# Altium schematic symbol library jlcpcb_2025_04_capacitors_extended_1206.schlib: 2503 symbols (part 8 of 14) (continued)
## CGA5L2X7R1E105KT0Y0N
designator C?  Capacitance: 1uF  (hidden comment: *)
Capacitor, Ceramic (MLCC), 1uF, ±10%, 25V, X7R, ±10%, SMD 1206; Manufacturer: TDK; Manufacturer Part Number: CGA5L2X7R1E105KT0Y0N; Package Size: 1206; JLCPCB Basic Part: No; JLCPCB Part Number: C342842; Supplier 1: LCSC; Category: Capacitors - MLCC; Supplier Part Number 1: C342842; Tolerance: ±10%; Voltage Rating: 25V; Temperature Coefficient: X7R; RoHS: Yes; ComponentLink1Description: Datasheet; ComponentLink1URL: https://wmsc.lcsc.com/wmsc/upload/file/pdf/v2/lcsc/2304140030_TDK-CGA5L2X7R1E105KT0Y0N_C342842.pdf; ComponentLink2Description: JLCPCB Part URL; ComponentLink2URL: https://jlcpcb.com/partdetail/C342842; ComponentLink3Description: LCSC Part URL; ComponentLink3URL: https://lcsc.com/product-detail/Multilayer-Ceramic-Capacitors-MLCC---SMD-SMT_TDK-TDK-CGA5L2X7R1E105KT0Y0N_C342842.html
footprint CAP-1206 (1206 (3216M) Capacitor)
pins: 1, 2

## CGA5L2X7R1E225KT0Y0N
designator C?  Capacitance: 2.2uF  (hidden comment: *)
Capacitor, Ceramic (MLCC), 2.2uF, ±10%, 25V, X7R, ±10%, SMD 1206; Manufacturer: TDK; Manufacturer Part Number: CGA5L2X7R1E225KT0Y0N; Package Size: 1206; JLCPCB Basic Part: No; JLCPCB Part Number: C2939049; Supplier 1: LCSC; Category: Capacitors - MLCC; Supplier Part Number 1: C2939049; Tolerance: ±10%; Voltage Rating: 25V; Temperature Coefficient: X7R; RoHS: Yes; ComponentLink1Description: Datasheet; ComponentLink1URL: https://wmsc.lcsc.com/wmsc/upload/file/pdf/v2/lcsc/2208240930_TDK-CGA5L2X7R1E225KT0Y0N_C2939049.pdf; ComponentLink2Description: JLCPCB Part URL; ComponentLink2URL: https://jlcpcb.com/partdetail/C2939049; ComponentLink3Description: LCSC Part URL; ComponentLink3URL: https://lcsc.com/product-detail/Multilayer-Ceramic-Capacitors-MLCC---SMD-SMT_TDK-TDK-CGA5L2X7R1E225KT0Y0N_C2939049.html
footprint CAP-1206 (1206 (3216M) Capacitor)
pins: 1, 2

## CGA5L2X7R1H684KT0Y0N
designator C?  Capacitance: 680nF  (hidden comment: *)
Capacitor, Ceramic (MLCC), 680nF, ±10%, 50V, X7R, ±10%, SMD 1206; Manufacturer: TDK; Manufacturer Part Number: CGA5L2X7R1H684KT0Y0N; Package Size: 1206; JLCPCB Basic Part: No; JLCPCB Part Number: C342826; Supplier 1: LCSC; Category: Capacitors - MLCC; Supplier Part Number 1: C342826; Tolerance: ±10%; Voltage Rating: 50V; Temperature Coefficient: X7R; RoHS: Yes; ComponentLink1Description: Datasheet; ComponentLink1URL: https://wmsc.lcsc.com/wmsc/upload/file/pdf/v2/lcsc/2304140030_TDK-CGA5L2X7R1H684KT0Y0N_C342826.pdf; ComponentLink2Description: JLCPCB Part URL; ComponentLink2URL: https://jlcpcb.com/partdetail/C342826; ComponentLink3Description: LCSC Part URL; ComponentLink3URL: https://lcsc.com/product-detail/Multilayer-Ceramic-Capacitors-MLCC---SMD-SMT_TDK-TDK-CGA5L2X7R1H684KT0Y0N_C342826.html
footprint CAP-1206 (1206 (3216M) Capacitor)
pins: 1, 2

## CGA5L2X7R2A104KT0Y0U
designator C?  Capacitance: 100nF  (hidden comment: *)
Capacitor, Ceramic (MLCC), 100nF, ±10%, 100V, X7R, ±10%, SMD 1206; Manufacturer: TDK; Manufacturer Part Number: CGA5L2X7R2A104KT0Y0U; Package Size: 1206; JLCPCB Basic Part: No; JLCPCB Part Number: C338057; Supplier 1: LCSC; Category: Capacitors - MLCC; Supplier Part Number 1: C338057; Tolerance: ±10%; Voltage Rating: 100V; Temperature Coefficient: X7R; RoHS: Yes; ComponentLink1Description: Datasheet; ComponentLink1URL: https://wmsc.lcsc.com/wmsc/upload/file/pdf/v2/lcsc/2304140030_TDK-CGA5L2X7R2A104KT0Y0U_C338057.pdf; ComponentLink2Description: JLCPCB Part URL; ComponentLink2URL: https://jlcpcb.com/partdetail/C338057; ComponentLink3Description: LCSC Part URL; ComponentLink3URL: https://lcsc.com/product-detail/Multilayer-Ceramic-Capacitors-MLCC---SMD-SMT_TDK-TDK-CGA5L2X7R2A104KT0Y0U_C338057.html
footprint CAP-1206 (1206 (3216M) Capacitor)
pins: 1, 2

## CGA5L2X7R2A105KT0Y0U
designator C?  Capacitance: 1uF  (hidden comment: *)
Capacitor, Ceramic (MLCC), 1uF, ±10%, 100V, X7R, ±10%, SMD 1206; Manufacturer: TDK; Manufacturer Part Number: CGA5L2X7R2A105KT0Y0U; Package Size: 1206; JLCPCB Basic Part: No; JLCPCB Part Number: C329948; Supplier 1: LCSC; Category: Capacitors - MLCC; Supplier Part Number 1: C329948; Tolerance: ±10%; Voltage Rating: 100V; Temperature Coefficient: X7R; RoHS: Yes; ComponentLink1Description: Datasheet; ComponentLink1URL: https://wmsc.lcsc.com/wmsc/upload/file/pdf/v2/lcsc/2304140030_TDK-CGA5L2X7R2A105KT0Y0U_C329948.pdf; ComponentLink2Description: JLCPCB Part URL; ComponentLink2URL: https://jlcpcb.com/partdetail/C329948; ComponentLink3Description: LCSC Part URL; ComponentLink3URL: https://lcsc.com/product-detail/Multilayer-Ceramic-Capacitors-MLCC---SMD-SMT_TDK-TDK-CGA5L2X7R2A105KT0Y0U_C329948.html
footprint CAP-1206 (1206 (3216M) Capacitor)
pins: 1, 2

## CGA5L2X7R2A474KT0Y0U
designator C?  Capacitance: 470nF  (hidden comment: *)
Capacitor, Ceramic (MLCC), 470nF, ±10%, 100V, X7R, ±10%, SMD 1206; Manufacturer: TDK; Manufacturer Part Number: CGA5L2X7R2A474KT0Y0U; Package Size: 1206; JLCPCB Basic Part: No; JLCPCB Part Number: C338107; Supplier 1: LCSC; Category: Capacitors - MLCC; Supplier Part Number 1: C338107; Tolerance: ±10%; Voltage Rating: 100V; Temperature Coefficient: X7R; RoHS: Yes; ComponentLink1Description: Datasheet; ComponentLink1URL: https://wmsc.lcsc.com/wmsc/upload/file/pdf/v2/lcsc/2304140030_TDK-CGA5L2X7R2A474KT0Y0U_C338107.pdf; ComponentLink2Description: JLCPCB Part URL; ComponentLink2URL: https://jlcpcb.com/partdetail/C338107; ComponentLink3Description: LCSC Part URL; ComponentLink3URL: https://lcsc.com/product-detail/Multilayer-Ceramic-Capacitors-MLCC---SMD-SMT_TDK-TDK-CGA5L2X7R2A474KT0Y0U_C338107.html
footprint CAP-1206 (1206 (3216M) Capacitor)
pins: 1, 2

## CGA5L3X5R1H106KT0Y0N
designator C?  Capacitance: 10uF  (hidden comment: *)
Capacitor, Ceramic (MLCC), 10uF, ±10%, 50V, X5R, ±10%, SMD 1206; Manufacturer: TDK; Manufacturer Part Number: CGA5L3X5R1H106KT0Y0N; Package Size: 1206; JLCPCB Basic Part: No; JLCPCB Part Number: C338079; Supplier 1: LCSC; Category: Capacitors - MLCC; Supplier Part Number 1: C338079; Tolerance: ±10%; Voltage Rating: 50V; Temperature Coefficient: X5R; RoHS: Yes; ComponentLink1Description: Datasheet; ComponentLink1URL: https://wmsc.lcsc.com/wmsc/upload/file/pdf/v2/lcsc/2304140030_TDK-CGA5L3X5R1H106KT0Y0N_C338079.pdf; ComponentLink2Description: JLCPCB Part URL; ComponentLink2URL: https://jlcpcb.com/partdetail/C338079; ComponentLink3Description: LCSC Part URL; ComponentLink3URL: https://lcsc.com/product-detail/Multilayer-Ceramic-Capacitors-MLCC---SMD-SMT_TDK-TDK-CGA5L3X5R1H106KT0Y0N_C338079.html
footprint CAP-1206 (1206 (3216M) Capacitor)
pins: 1, 2

## CGA5L3X7R1H105KT0Y0N
designator C?  Capacitance: 1uF  (hidden comment: *)
Capacitor, Ceramic (MLCC), 1uF, ±10%, 50V, X7R, ±10%, SMD 1206; Manufacturer: TDK; Manufacturer Part Number: CGA5L3X7R1H105KT0Y0N; Package Size: 1206; JLCPCB Basic Part: No; JLCPCB Part Number: C329965; Supplier 1: LCSC; Category: Capacitors - MLCC; Supplier Part Number 1: C329965; Tolerance: ±10%; Voltage Rating: 50V; Temperature Coefficient: X7R; RoHS: Yes; ComponentLink1Description: Datasheet; ComponentLink1URL: https://wmsc.lcsc.com/wmsc/upload/file/pdf/v2/lcsc/2304140030_TDK-CGA5L3X7R1H105KT0Y0N_C329965.pdf; ComponentLink2Description: JLCPCB Part URL; ComponentLink2URL: https://jlcpcb.com/partdetail/C329965; ComponentLink3Description: LCSC Part URL; ComponentLink3URL: https://lcsc.com/product-detail/Multilayer-Ceramic-Capacitors-MLCC---SMD-SMT_TDK-TDK-CGA5L3X7R1H105KT0Y0N_C329965.html
footprint CAP-1206 (1206 (3216M) Capacitor)
pins: 1, 2

## CGA5L3X7R1H105KT0Y0S
designator C?  Capacitance: 1uF  (hidden comment: *)
Capacitor, Ceramic (MLCC), 1uF, ±10%, 50V, X7R, ±10%, SMD 1206; Manufacturer: TDK; Manufacturer Part Number: CGA5L3X7R1H105KT0Y0S; Package Size: 1206; JLCPCB Basic Part: No; JLCPCB Part Number: C432948; Supplier 1: LCSC; Category: Capacitors - MLCC; Supplier Part Number 1: C432948; Tolerance: ±10%; Voltage Rating: 50V; Temperature Coefficient: X7R; RoHS: Yes; ComponentLink1Description: Datasheet; ComponentLink1URL: https://wmsc.lcsc.com/wmsc/upload/file/pdf/v2/lcsc/2304140030_TDK-CGA5L3X7R1H105KT0Y0S_C432948.pdf; ComponentLink2Description: JLCPCB Part URL; ComponentLink2URL: https://jlcpcb.com/partdetail/C432948; ComponentLink3Description: LCSC Part URL; ComponentLink3URL: https://lcsc.com/product-detail/Multilayer-Ceramic-Capacitors-MLCC---SMD-SMT_TDK-TDK-CGA5L3X7R1H105KT0Y0S_C432948.html
footprint CAP-1206 (1206 (3216M) Capacitor)
pins: 1, 2

## CGA5L3X7R1H225KT0Y0N
designator C?  Capacitance: 2.2uF  (hidden comment: *)
Capacitor, Ceramic (MLCC), 2.2uF, ±10%, 50V, X7R, ±10%, SMD 1206; Manufacturer: TDK; Manufacturer Part Number: CGA5L3X7R1H225KT0Y0N; Package Size: 1206; JLCPCB Basic Part: No; JLCPCB Part Number: C342683; Supplier 1: LCSC; Category: Capacitors - MLCC; Supplier Part Number 1: C342683; Tolerance: ±10%; Voltage Rating: 50V; Temperature Coefficient: X7R; RoHS: Yes; ComponentLink1Description: Datasheet; ComponentLink1URL: https://wmsc.lcsc.com/wmsc/upload/file/pdf/v2/lcsc/2304140030_TDK-CGA5L3X7R1H225KT0Y0N_C342683.pdf; ComponentLink2Description: JLCPCB Part URL; ComponentLink2URL: https://jlcpcb.com/partdetail/C342683; ComponentLink3Description: LCSC Part URL; ComponentLink3URL: https://lcsc.com/product-detail/Multilayer-Ceramic-Capacitors-MLCC---SMD-SMT_TDK-TDK-CGA5L3X7R1H225KT0Y0N_C342683.html
footprint CAP-1206 (1206 (3216M) Capacitor)
pins: 1, 2

## CGA5L3X7R1H225KT0Y0S
designator C?  Capacitance: 2.2uF  (hidden comment: *)
Capacitor, Ceramic (MLCC), 2.2uF, ±10%, 50V, X7R, ±10%, SMD 1206; Manufacturer: TDK; Manufacturer Part Number: CGA5L3X7R1H225KT0Y0S; Package Size: 1206; JLCPCB Basic Part: No; JLCPCB Part Number: C338116; Supplier 1: LCSC; Category: Capacitors - MLCC; Supplier Part Number 1: C338116; Tolerance: ±10%; Voltage Rating: 50V; Temperature Coefficient: X7R; RoHS: Yes; ComponentLink1Description: Datasheet; ComponentLink1URL: https://wmsc.lcsc.com/wmsc/upload/file/pdf/v2/lcsc/2304140030_TDK-CGA5L3X7R1H225KT0Y0S_C338116.pdf; ComponentLink2Description: JLCPCB Part URL; ComponentLink2URL: https://jlcpcb.com/partdetail/C338116; ComponentLink3Description: LCSC Part URL; ComponentLink3URL: https://lcsc.com/product-detail/Multilayer-Ceramic-Capacitors-MLCC---SMD-SMT_TDK-TDK-CGA5L3X7R1H225KT0Y0S_C338116.html
footprint CAP-1206 (1206 (3216M) Capacitor)
pins: 1, 2

## CGA5L3X7R1H475KT000N
designator C?  Capacitance: 4.7uF  (hidden comment: *)
Capacitor, Ceramic (MLCC), 4.7uF, ±10%, 50V, X7R, ±10%, SMD 1206; Manufacturer: TDK; Manufacturer Part Number: CGA5L3X7R1H475KT000N; Package Size: 1206; JLCPCB Basic Part: No; JLCPCB Part Number: C342665; Supplier 1: LCSC; Category: Capacitors - MLCC; Supplier Part Number 1: C342665; Tolerance: ±10%; Voltage Rating: 50V; Temperature Coefficient: X7R; RoHS: Yes; ComponentLink1Description: Datasheet; ComponentLink1URL: https://wmsc.lcsc.com/wmsc/upload/file/pdf/v2/lcsc/2304140030_TDK-CGA5L3X7R1H475KT000N_C342665.pdf; ComponentLink2Description: JLCPCB Part URL; ComponentLink2URL: https://jlcpcb.com/partdetail/C342665; ComponentLink3Description: LCSC Part URL; ComponentLink3URL: https://lcsc.com/product-detail/Multilayer-Ceramic-Capacitors-MLCC---SMD-SMT_TDK-TDK-CGA5L3X7R1H475KT000N_C342665.html
footprint CAP-1206 (1206 (3216M) Capacitor)
pins: 1, 2

## CGA5L3X7R2E104KT0Y0U
designator C?  Capacitance: 100nF  (hidden comment: *)
Capacitor, Ceramic (MLCC), 100nF, ±10%, 250V, X7R, ±10%, SMD 1206; Manufacturer: TDK; Manufacturer Part Number: CGA5L3X7R2E104KT0Y0U; Package Size: 1206; JLCPCB Basic Part: No; JLCPCB Part Number: C342817; Supplier 1: LCSC; Category: Capacitors - MLCC; Supplier Part Number 1: C342817; Tolerance: ±10%; Voltage Rating: 250V; Temperature Coefficient: X7R; RoHS: Yes; ComponentLink1Description: Datasheet; ComponentLink1URL: https://wmsc.lcsc.com/wmsc/upload/file/pdf/v2/lcsc/2304140030_TDK-CGA5L3X7R2E104KT0Y0U_C342817.pdf; ComponentLink2Description: JLCPCB Part URL; ComponentLink2URL: https://jlcpcb.com/partdetail/C342817; ComponentLink3Description: LCSC Part URL; ComponentLink3URL: https://lcsc.com/product-detail/Multilayer-Ceramic-Capacitors-MLCC---SMD-SMT_TDK-TDK-CGA5L3X7R2E104KT0Y0U_C342817.html
footprint CAP-1206 (1206 (3216M) Capacitor)
pins: 1, 2

## CGA5L3X7S2A225KT0Y0N
designator C?  Capacitance: 2.2uF  (hidden comment: *)
Capacitor, Ceramic (MLCC), 2.2uF, ±10%, 100V, X7S, ±10%, SMD 1206; Manufacturer: TDK; Manufacturer Part Number: CGA5L3X7S2A225KT0Y0N; Package Size: 1206; JLCPCB Basic Part: No; JLCPCB Part Number: C342669; Supplier 1: LCSC; Category: Capacitors - MLCC; Supplier Part Number 1: C342669; Tolerance: ±10%; Voltage Rating: 100V; Temperature Coefficient: X7S; RoHS: Yes; ComponentLink1Description: Datasheet; ComponentLink1URL: https://wmsc.lcsc.com/wmsc/upload/file/pdf/v2/lcsc/2304140030_TDK-CGA5L3X7S2A225KT0Y0N_C342669.pdf; ComponentLink2Description: JLCPCB Part URL; ComponentLink2URL: https://jlcpcb.com/partdetail/C342669; ComponentLink3Description: LCSC Part URL; ComponentLink3URL: https://lcsc.com/product-detail/Multilayer-Ceramic-Capacitors-MLCC---SMD-SMT_TDK-TDK-CGA5L3X7S2A225KT0Y0N_C342669.html
footprint CAP-1206 (1206 (3216M) Capacitor)
pins: 1, 2

## CGA5L3X8R1E225KT0Y0N
designator C?  Capacitance: 2.2uF  (hidden comment: *)
Capacitor, Ceramic (MLCC), 2.2uF, ±10%, 25V, X8R, ±10%, SMD 1206; Manufacturer: TDK; Manufacturer Part Number: CGA5L3X8R1E225KT0Y0N; Package Size: 1206; JLCPCB Basic Part: No; JLCPCB Part Number: C694517; Supplier 1: LCSC; Category: Capacitors - MLCC; Supplier Part Number 1: C694517; Tolerance: ±10%; Voltage Rating: 25V; Temperature Coefficient: X8R; RoHS: Yes; ComponentLink1Description: Datasheet; ComponentLink1URL: https://wmsc.lcsc.com/wmsc/upload/file/pdf/v2/lcsc/2208221800_TDK-CGA5L3X8R1E225KT0Y0N_C694517.pdf; ComponentLink2Description: JLCPCB Part URL; ComponentLink2URL: https://jlcpcb.com/partdetail/C694517; ComponentLink3Description: LCSC Part URL; ComponentLink3URL: https://lcsc.com/product-detail/Multilayer-Ceramic-Capacitors-MLCC---SMD-SMT_TDK-TDK-CGA5L3X8R1E225KT0Y0N_C694517.html
footprint CAP-1206 (1206 (3216M) Capacitor)
pins: 1, 2

## CGA5L3X8R1H105KT0Y0N
designator C?  Capacitance: 1uF  (hidden comment: *)
Capacitor, Ceramic (MLCC), 1uF, ±10%, X8R, ±10%, SMD 1206; Manufacturer: TDK; Manufacturer Part Number: CGA5L3X8R1H105KT0Y0N; Package Size: 1206; JLCPCB Basic Part: No; JLCPCB Part Number: C342628; Supplier 1: LCSC; Category: Capacitors - MLCC; Supplier Part Number 1: C342628; Tolerance: ±10%; Temperature Coefficient: X8R; RoHS: Yes; ComponentLink1Description: Datasheet; ComponentLink1URL: https://wmsc.lcsc.com/wmsc/upload/file/pdf/v2/lcsc/2304140030_TDK-CGA5L3X8R1H105KT0Y0N_C342628.pdf; ComponentLink2Description: JLCPCB Part URL; ComponentLink2URL: https://jlcpcb.com/partdetail/C342628; ComponentLink3Description: LCSC Part URL; ComponentLink3URL: https://lcsc.com/product-detail/Multilayer-Ceramic-Capacitors-MLCC---SMD-SMT_TDK-TDK-CGA5L3X8R1H105KT0Y0N_C342628.html
footprint CAP-1206 (1206 (3216M) Capacitor)
pins: 1, 2

## CGA5L4C0G2J103JT0Y0N
designator C?  Capacitance: 10nF  (hidden comment: *)
Capacitor, Ceramic (MLCC), 10nF, ±5%, 630V, C0G, ±5%, SMD 1206; Manufacturer: TDK; Manufacturer Part Number: CGA5L4C0G2J103JT0Y0N; Package Size: 1206; JLCPCB Basic Part: No; JLCPCB Part Number: C360359; Supplier 1: LCSC; Category: Capacitors - MLCC; Supplier Part Number 1: C360359; Tolerance: ±5%; Voltage Rating: 630V; Temperature Coefficient: C0G; RoHS: Yes; ComponentLink1Description: Datasheet; ComponentLink1URL: https://wmsc.lcsc.com/wmsc/upload/file/pdf/v2/lcsc/1912111437_TDK-CGA5L4C0G2J103JT0Y0N_C360359.pdf; ComponentLink2Description: JLCPCB Part URL; ComponentLink2URL: https://jlcpcb.com/partdetail/C360359; ComponentLink3Description: LCSC Part URL; ComponentLink3URL: https://lcsc.com/product-detail/Multilayer-Ceramic-Capacitors-MLCC---SMD-SMT_TDK-TDK-CGA5L4C0G2J103JT0Y0N_C360359.html
footprint CAP-1206 (1206 (3216M) Capacitor)
pins: 1, 2

## CGA5L4X7T2W104KT0Y0N
designator C?  Capacitance: 100nF  (hidden comment: *)
Capacitor, Ceramic (MLCC), 100nF, ±10%, 450V, X7T, ±10%, SMD 1206; Manufacturer: TDK; Manufacturer Part Number: CGA5L4X7T2W104KT0Y0N; Package Size: 1206; JLCPCB Basic Part: No; JLCPCB Part Number: C342697; Supplier 1: LCSC; Category: Capacitors - MLCC; Supplier Part Number 1: C342697; Tolerance: ±10%; Voltage Rating: 450V; Temperature Coefficient: X7T; RoHS: Yes; ComponentLink1Description: Datasheet; ComponentLink1URL: https://wmsc.lcsc.com/wmsc/upload/file/pdf/v2/lcsc/2304140030_TDK-CGA5L4X7T2W104KT0Y0N_C342697.pdf; ComponentLink2Description: JLCPCB Part URL; ComponentLink2URL: https://jlcpcb.com/partdetail/C342697; ComponentLink3Description: LCSC Part URL; ComponentLink3URL: https://lcsc.com/product-detail/Multilayer-Ceramic-Capacitors-MLCC---SMD-SMT_TDK-TDK-CGA5L4X7T2W104KT0Y0N_C342697.html
footprint CAP-1206 (1206 (3216M) Capacitor)
pins: 1, 2

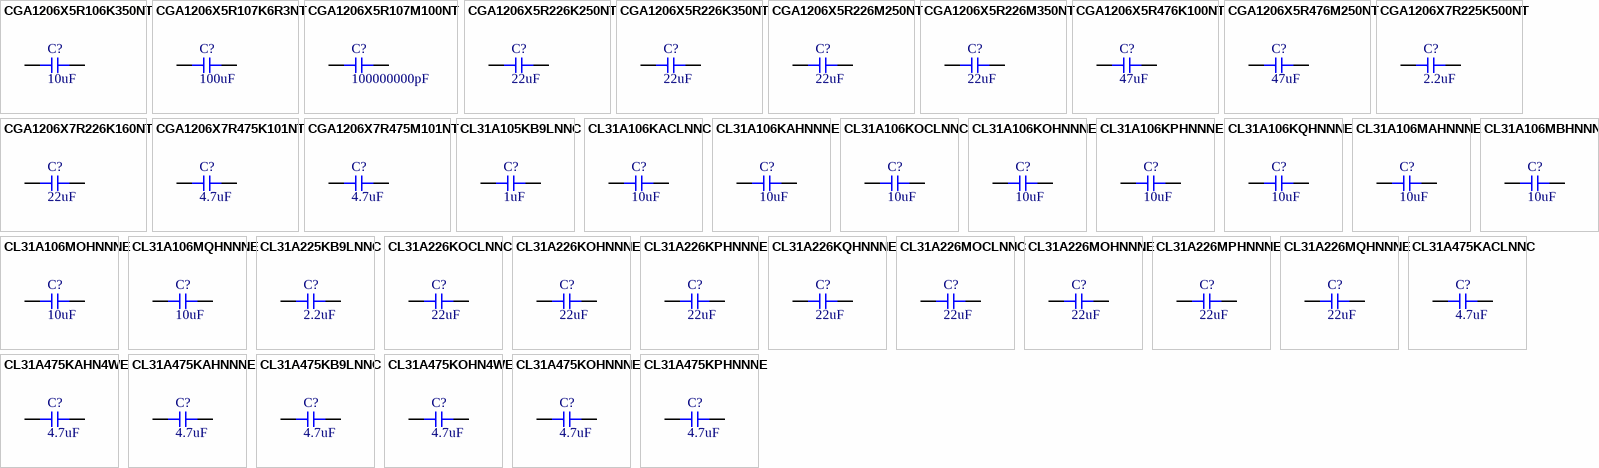
[diagram p36: symbols CGA1206X5R106K350NT to CL31A475KPHNNNE]

## CGA1206X5R106K350NT
designator C?  Capacitance: 10uF  (hidden comment: *)
Capacitor, Ceramic (MLCC), 10uF, ±10%, 35V, X5R, ±10%, SMD 1206; Manufacturer: HRE; Manufacturer Part Number: CGA1206X5R106K350NT; Package Size: 1206; JLCPCB Basic Part: No; JLCPCB Part Number: C6119957; Supplier 1: LCSC; Category: Capacitors - MLCC; Supplier Part Number 1: C6119957; Tolerance: ±10%; Voltage Rating: 35V; Temperature Coefficient: X5R; RoHS: Yes; ComponentLink1Description: Datasheet; ComponentLink2Description: JLCPCB Part URL; ComponentLink2URL: https://jlcpcb.com/partdetail/C6119957; ComponentLink3Description: LCSC Part URL; ComponentLink3URL: https://lcsc.com/product-detail/Multilayer-Ceramic-Capacitors-MLCC---SMD-SMT_HRE-HRE-CGA1206X5R106K350NT_C6119957.html
footprint CAP-1206 (1206 (3216M) Capacitor)
pins: 1, 2

## CGA1206X5R107K6R3NT
designator C?  Capacitance: 100uF  (hidden comment: *)
Capacitor, Ceramic (MLCC), 100uF, ±10%, 6.3V, X5R, ±10%, SMD 1206; Manufacturer: HRE; Manufacturer Part Number: CGA1206X5R107K6R3NT; Package Size: 1206; JLCPCB Basic Part: No; JLCPCB Part Number: C6119960; Supplier 1: LCSC; Category: Capacitors - MLCC; Supplier Part Number 1: C6119960; Tolerance: ±10%; Voltage Rating: 6.3V; Temperature Coefficient: X5R; RoHS: Yes; ComponentLink1Description: Datasheet; ComponentLink2Description: JLCPCB Part URL; ComponentLink2URL: https://jlcpcb.com/partdetail/C6119960; ComponentLink3Description: LCSC Part URL; ComponentLink3URL: https://lcsc.com/product-detail/Multilayer-Ceramic-Capacitors-MLCC---SMD-SMT_HRE-HRE-CGA1206X5R107K6R3NT_C6119960.html
footprint CAP-1206 (1206 (3216M) Capacitor)
pins: 1, 2

## CGA1206X5R107M100NT
designator C?  Capacitance: 100000000pF  (hidden comment: *)
Capacitor, Ceramic (MLCC), 100000000pF, ±20%, 10V, X5R, ±20%, SMD 1206; Manufacturer: HRE; Manufacturer Part Number: CGA1206X5R107M100NT; Package Size: 1206; JLCPCB Basic Part: No; JLCPCB Part Number: C6119961; Supplier 1: LCSC; Category: Capacitors - MLCC; Supplier Part Number 1: C6119961; Tolerance: ±20%; Voltage Rating: 10V; Temperature Coefficient: X5R; RoHS: Yes; ComponentLink1Description: Datasheet; ComponentLink1URL: https://wmsc.lcsc.com/wmsc/upload/file/pdf/v2/lcsc/2402281425_HRE-CGA1206X5R107M100NT_C6119961.pdf; ComponentLink2Description: JLCPCB Part URL; ComponentLink2URL: https://jlcpcb.com/partdetail/C6119961; ComponentLink3Description: LCSC Part URL; ComponentLink3URL: https://lcsc.com/product-detail/Multilayer-Ceramic-Capacitors-MLCC---SMD-SMT_HRE-HRE-CGA1206X5R107M100NT_C6119961.html
footprint CAP-1206 (1206 (3216M) Capacitor)
pins: 1, 2

## CGA1206X5R226K250NT
designator C?  Capacitance: 22uF  (hidden comment: *)
Capacitor, Ceramic (MLCC), 22uF, ±10%, 25V, X5R, ±10%, SMD 1206; Manufacturer: HRE; Manufacturer Part Number: CGA1206X5R226K250NT; Package Size: 1206; JLCPCB Basic Part: No; JLCPCB Part Number: C6119965; Supplier 1: LCSC; Category: Capacitors - MLCC; Supplier Part Number 1: C6119965; Tolerance: ±10%; Voltage Rating: 25V; Temperature Coefficient: X5R; RoHS: Yes; ComponentLink1Description: Datasheet; ComponentLink2Description: JLCPCB Part URL; ComponentLink2URL: https://jlcpcb.com/partdetail/C6119965; ComponentLink3Description: LCSC Part URL; ComponentLink3URL: https://lcsc.com/product-detail/Multilayer-Ceramic-Capacitors-MLCC---SMD-SMT_HRE-HRE-CGA1206X5R226K250NT_C6119965.html
footprint CAP-1206 (1206 (3216M) Capacitor)
pins: 1, 2

## CGA1206X5R226K350NT
designator C?  Capacitance: 22uF  (hidden comment: *)
Capacitor, Ceramic (MLCC), 22uF, ±10%, 35V, X5R, ±10%, SMD 1206; Manufacturer: HRE; Manufacturer Part Number: CGA1206X5R226K350NT; Package Size: 1206; JLCPCB Basic Part: No; JLCPCB Part Number: C6119966; Supplier 1: LCSC; Category: Capacitors - MLCC; Supplier Part Number 1: C6119966; Tolerance: ±10%; Voltage Rating: 35V; Temperature Coefficient: X5R; RoHS: Yes; ComponentLink1Description: Datasheet; ComponentLink2Description: JLCPCB Part URL; ComponentLink2URL: https://jlcpcb.com/partdetail/C6119966; ComponentLink3Description: LCSC Part URL; ComponentLink3URL: https://lcsc.com/product-detail/Multilayer-Ceramic-Capacitors-MLCC---SMD-SMT_HRE-HRE-CGA1206X5R226K350NT_C6119966.html
footprint CAP-1206 (1206 (3216M) Capacitor)
pins: 1, 2

## CGA1206X5R226M250NT
designator C?  Capacitance: 22uF  (hidden comment: *)
Capacitor, Ceramic (MLCC), 22uF, ±20%, 25V, X5R, ±20%, SMD 1206; Manufacturer: HRE; Manufacturer Part Number: CGA1206X5R226M250NT; Package Size: 1206; JLCPCB Basic Part: No; JLCPCB Part Number: C6119968; Supplier 1: LCSC; Category: Capacitors - MLCC; Supplier Part Number 1: C6119968; Tolerance: ±20%; Voltage Rating: 25V; Temperature Coefficient: X5R; RoHS: Yes; ComponentLink1Description: Datasheet; ComponentLink2Description: JLCPCB Part URL; ComponentLink2URL: https://jlcpcb.com/partdetail/C6119968; ComponentLink3Description: LCSC Part URL; ComponentLink3URL: https://lcsc.com/product-detail/Multilayer-Ceramic-Capacitors-MLCC---SMD-SMT_HRE-HRE-CGA1206X5R226M250NT_C6119968.html
footprint CAP-1206 (1206 (3216M) Capacitor)
pins: 1, 2

## CGA1206X5R226M350NT
designator C?  Capacitance: 22uF  (hidden comment: *)
Capacitor, Ceramic (MLCC), 22uF, ±20%, 35V, X5R, ±20%, SMD 1206; Manufacturer: HRE; Manufacturer Part Number: CGA1206X5R226M350NT; Package Size: 1206; JLCPCB Basic Part: No; JLCPCB Part Number: C6119969; Supplier 1: LCSC; Category: Capacitors - MLCC; Supplier Part Number 1: C6119969; Tolerance: ±20%; Voltage Rating: 35V; Temperature Coefficient: X5R; RoHS: Yes; ComponentLink1Description: Datasheet; ComponentLink2Description: JLCPCB Part URL; ComponentLink2URL: https://jlcpcb.com/partdetail/C6119969; ComponentLink3Description: LCSC Part URL; ComponentLink3URL: https://lcsc.com/product-detail/Multilayer-Ceramic-Capacitors-MLCC---SMD-SMT_HRE-HRE-CGA1206X5R226M350NT_C6119969.html
footprint CAP-1206 (1206 (3216M) Capacitor)
pins: 1, 2

## CGA1206X5R476K100NT
designator C?  Capacitance: 47uF  (hidden comment: *)
Capacitor, Ceramic (MLCC), 47uF, ±10%, 10V, X5R, ±10%, SMD 1206; Manufacturer: HRE; Manufacturer Part Number: CGA1206X5R476K100NT; Package Size: 1206; JLCPCB Basic Part: No; JLCPCB Part Number: C6119970; Supplier 1: LCSC; Category: Capacitors - MLCC; Supplier Part Number 1: C6119970; Tolerance: ±10%; Voltage Rating: 10V; Temperature Coefficient: X5R; RoHS: Yes; ComponentLink1Description: Datasheet; ComponentLink2Description: JLCPCB Part URL; ComponentLink2URL: https://jlcpcb.com/partdetail/C6119970; ComponentLink3Description: LCSC Part URL; ComponentLink3URL: https://lcsc.com/product-detail/Multilayer-Ceramic-Capacitors-MLCC---SMD-SMT_HRE-HRE-CGA1206X5R476K100NT_C6119970.html
footprint CAP-1206 (1206 (3216M) Capacitor)
pins: 1, 2

## CGA1206X5R476M250NT
designator C?  Capacitance: 47uF  (hidden comment: *)
Capacitor, Ceramic (MLCC), 47uF, ±20%, 25V, X5R, ±20%, SMD 1206; Manufacturer: HRE; Manufacturer Part Number: CGA1206X5R476M250NT; Package Size: 1206; JLCPCB Basic Part: No; JLCPCB Part Number: C6119973; Supplier 1: LCSC; Category: Capacitors - MLCC; Supplier Part Number 1: C6119973; Tolerance: ±20%; Voltage Rating: 25V; Temperature Coefficient: X5R; RoHS: Yes; ComponentLink1Description: Datasheet; ComponentLink1URL: https://wmsc.lcsc.com/wmsc/upload/file/pdf/v2/lcsc/2402291546_HRE-CGA1206X5R476M250NT_C6119973.pdf; ComponentLink2Description: JLCPCB Part URL; ComponentLink2URL: https://jlcpcb.com/partdetail/C6119973; ComponentLink3Description: LCSC Part URL; ComponentLink3URL: https://lcsc.com/product-detail/Multilayer-Ceramic-Capacitors-MLCC---SMD-SMT_HRE-HRE-CGA1206X5R476M250NT_C6119973.html
footprint CAP-1206 (1206 (3216M) Capacitor)
pins: 1, 2

## CGA1206X7R225K500NT
designator C?  Capacitance: 2.2uF  (hidden comment: *)
Capacitor, Ceramic (MLCC), 2.2uF, ±10%, 50V, X7R, ±10%, SMD 1206; Manufacturer: HRE; Manufacturer Part Number: CGA1206X7R225K500NT; Package Size: 1206; JLCPCB Basic Part: No; JLCPCB Part Number: C6119993; Supplier 1: LCSC; Category: Capacitors - MLCC; Supplier Part Number 1: C6119993; Tolerance: ±10%; Voltage Rating: 50V; Temperature Coefficient: X7R; RoHS: Yes; ComponentLink1Description: Datasheet; ComponentLink2Description: JLCPCB Part URL; ComponentLink2URL: https://jlcpcb.com/partdetail/C6119993; ComponentLink3Description: LCSC Part URL; ComponentLink3URL: https://lcsc.com/product-detail/Multilayer-Ceramic-Capacitors-MLCC---SMD-SMT_HRE-HRE-CGA1206X7R225K500NT_C6119993.html
footprint CAP-1206 (1206 (3216M) Capacitor)
pins: 1, 2

## CGA1206X7R226K160NT
designator C?  Capacitance: 22uF  (hidden comment: *)
Capacitor, Ceramic (MLCC), 22uF, ±10%, 16V, X7R, ±10%, SMD 1206; Manufacturer: HRE; Manufacturer Part Number: CGA1206X7R226K160NT; Package Size: 1206; JLCPCB Basic Part: No; JLCPCB Part Number: C6119995; Supplier 1: LCSC; Category: Capacitors - MLCC; Supplier Part Number 1: C6119995; Tolerance: ±10%; Voltage Rating: 16V; Temperature Coefficient: X7R; RoHS: Yes; ComponentLink1Description: Datasheet; ComponentLink2Description: JLCPCB Part URL; ComponentLink2URL: https://jlcpcb.com/partdetail/C6119995; ComponentLink3Description: LCSC Part URL; ComponentLink3URL: https://lcsc.com/product-detail/Multilayer-Ceramic-Capacitors-MLCC---SMD-SMT_HRE-HRE-CGA1206X7R226K160NT_C6119995.html
footprint CAP-1206 (1206 (3216M) Capacitor)
pins: 1, 2

## CGA1206X7R475K101NT
designator C?  Capacitance: 4.7uF  (hidden comment: *)
Capacitor, Ceramic (MLCC), 4.7uF, ±10%, 100V, X7R, ±10%, SMD 1206; Manufacturer: HRE; Manufacturer Part Number: CGA1206X7R475K101NT; Package Size: 1206; JLCPCB Basic Part: No; JLCPCB Part Number: C6119999; Supplier 1: LCSC; Category: Capacitors - MLCC; Supplier Part Number 1: C6119999; Tolerance: ±10%; Voltage Rating: 100V; Temperature Coefficient: X7R; RoHS: Yes; ComponentLink1Description: Datasheet; ComponentLink2Description: JLCPCB Part URL; ComponentLink2URL: https://jlcpcb.com/partdetail/C6119999; ComponentLink3Description: LCSC Part URL; ComponentLink3URL: https://lcsc.com/product-detail/Multilayer-Ceramic-Capacitors-MLCC---SMD-SMT_HRE-HRE-CGA1206X7R475K101NT_C6119999.html
footprint CAP-1206 (1206 (3216M) Capacitor)
pins: 1, 2

## CGA1206X7R475M101NT
designator C?  Capacitance: 4.7uF  (hidden comment: *)
Capacitor, Ceramic (MLCC), 4.7uF, ±20%, 100V, X7R, ±20%, SMD 1206; Manufacturer: HRE; Manufacturer Part Number: CGA1206X7R475M101NT; Package Size: 1206; JLCPCB Basic Part: No; JLCPCB Part Number: C6120002; Supplier 1: LCSC; Category: Capacitors - MLCC; Supplier Part Number 1: C6120002; Tolerance: ±20%; Voltage Rating: 100V; Temperature Coefficient: X7R; RoHS: Yes; ComponentLink1Description: Datasheet; ComponentLink1URL: https://wmsc.lcsc.com/wmsc/upload/file/pdf/v2/lcsc/2405221049_HRE-CGA1206X7R475M101NT_C6120002.pdf; ComponentLink2Description: JLCPCB Part URL; ComponentLink2URL: https://jlcpcb.com/partdetail/C6120002; ComponentLink3Description: LCSC Part URL; ComponentLink3URL: https://lcsc.com/product-detail/Multilayer-Ceramic-Capacitors-MLCC---SMD-SMT_HRE-HRE-CGA1206X7R475M101NT_C6120002.html
footprint CAP-1206 (1206 (3216M) Capacitor)
pins: 1, 2

## CL31A105KB9LNNC
designator C?  Capacitance: 1uF  (hidden comment: *)
Capacitor, Ceramic (MLCC), 1uF, ±10%, 50V, X5R, ±10%, SMD 1206; Manufacturer: Samsung Electro-Mechanics; Manufacturer Part Number: CL31A105KB9LNNC; Package Size: 1206; JLCPCB Basic Part: No; JLCPCB Part Number: C444884; Supplier 1: LCSC; Category: Capacitors - MLCC; Supplier Part Number 1: C444884; Tolerance: ±10%; Voltage Rating: 50V; Temperature Coefficient: X5R; RoHS: Yes; ComponentLink1Description: Datasheet; ComponentLink1URL: https://wmsc.lcsc.com/wmsc/upload/file/pdf/v2/lcsc/2304140030_Samsung-Electro-Mechanics-CL31A105KB9LNNC_C444884.pdf; ComponentLink2Description: JLCPCB Part URL; ComponentLink2URL: https://jlcpcb.com/partdetail/C444884; ComponentLink3Description: LCSC Part URL; ComponentLink3URL: https://lcsc.com/product-detail/Multilayer-Ceramic-Capacitors-MLCC---SMD-SMT_Samsung-Electro-Mechanics-Samsung-Electro-Mechanics-CL31A105KB9LNNC_C444884.html; ComponentLink4Description: Samsung Component Library; ComponentLink4URL: https://weblib.samsungsem.com/mlcc/mlcc-ec.do?partNumber=CL31A105KB9LNN
footprint CAP-1206 (1206 (3216M) Capacitor)
pins: 1, 2

## CL31A106KACLNNC
designator C?  Capacitance: 10uF  (hidden comment: *)
Capacitor, Ceramic (MLCC), 10uF, ±10%, 25V, X5R, ±10%, SMD 1206; Manufacturer: Samsung Electro-Mechanics; Manufacturer Part Number: CL31A106KACLNNC; Package Size: 1206; JLCPCB Basic Part: No; JLCPCB Part Number: C318755; Supplier 1: LCSC; Category: Capacitors - MLCC; Supplier Part Number 1: C318755; Tolerance: ±10%; Voltage Rating: 25V; Temperature Coefficient: X5R; RoHS: Yes; ComponentLink1Description: Datasheet; ComponentLink1URL: https://wmsc.lcsc.com/wmsc/upload/file/pdf/v2/lcsc/2304140030_Samsung-Electro-Mechanics-CL31A106KACLNNC_C318755.pdf; ComponentLink2Description: JLCPCB Part URL; ComponentLink2URL: https://jlcpcb.com/partdetail/C318755; ComponentLink3Description: LCSC Part URL; ComponentLink3URL: https://lcsc.com/product-detail/Multilayer-Ceramic-Capacitors-MLCC---SMD-SMT_Samsung-Electro-Mechanics-Samsung-Electro-Mechanics-CL31A106KACLNNC_C318755.html; ComponentLink4Description: Samsung Component Library; ComponentLink4URL: https://weblib.samsungsem.com/mlcc/mlcc-ec.do?partNumber=CL31A106KACLNN
footprint CAP-1206 (1206 (3216M) Capacitor)
pins: 1, 2

## CL31A106KAHNNNE
designator C?  Capacitance: 10uF  (hidden comment: *)
Capacitor, Ceramic (MLCC), 10uF, ±10%, 25V, X5R, ±10%, SMD 1206; Manufacturer: Samsung Electro-Mechanics; Manufacturer Part Number: CL31A106KAHNNNE; Package Size: 1206; JLCPCB Basic Part: No; JLCPCB Part Number: C9807; Supplier 1: LCSC; Category: Capacitors - MLCC; Supplier Part Number 1: C9807; Tolerance: ±10%; Voltage Rating: 25V; Temperature Coefficient: X5R; RoHS: Yes; ComponentLink1Description: Datasheet; ComponentLink1URL: https://wmsc.lcsc.com/wmsc/upload/file/pdf/v2/lcsc/2304140030_Samsung-Electro-Mechanics-CL31A106KAHNNNE_C9807.pdf; ComponentLink2Description: JLCPCB Part URL; ComponentLink2URL: https://jlcpcb.com/partdetail/C9807; ComponentLink3Description: LCSC Part URL; ComponentLink3URL: https://lcsc.com/product-detail/Multilayer-Ceramic-Capacitors-MLCC---SMD-SMT_Samsung-Electro-Mechanics-Samsung-Electro-Mechanics-CL31A106KAHNNNE_C9807.html; ComponentLink4Description: Samsung Component Library; ComponentLink4URL: https://weblib.samsungsem.com/mlcc/mlcc-ec.do?partNumber=CL31A106KAHNNN
footprint CAP-1206 (1206 (3216M) Capacitor)
pins: 1, 2

## CL31A106KOCLNNC
designator C?  Capacitance: 10uF  (hidden comment: *)
Capacitor, Ceramic (MLCC), 10uF, ±10%, 16V, X5R, ±10%, SMD 1206; Manufacturer: Samsung Electro-Mechanics; Manufacturer Part Number: CL31A106KOCLNNC; Package Size: 1206; JLCPCB Basic Part: No; JLCPCB Part Number: C2762604; Supplier 1: LCSC; Category: Capacitors - MLCC; Supplier Part Number 1: C2762604; Tolerance: ±10%; Voltage Rating: 16V; Temperature Coefficient: X5R; RoHS: Yes; ComponentLink1Description: Datasheet; ComponentLink1URL: https://wmsc.lcsc.com/wmsc/upload/file/pdf/v2/lcsc/2304140030_Samsung-Electro-Mechanics-CL31A106KOCLNNC_C2762604.pdf; ComponentLink2Description: JLCPCB Part URL; ComponentLink2URL: https://jlcpcb.com/partdetail/C2762604; ComponentLink3Description: LCSC Part URL; ComponentLink3URL: https://lcsc.com/product-detail/Multilayer-Ceramic-Capacitors-MLCC---SMD-SMT_Samsung-Electro-Mechanics-Samsung-Electro-Mechanics-CL31A106KOCLNNC_C2762604.html; ComponentLink4Description: Samsung Component Library; ComponentLink4URL: https://weblib.samsungsem.com/mlcc/mlcc-ec.do?partNumber=CL31A106KOCLNN
footprint CAP-1206 (1206 (3216M) Capacitor)
pins: 1, 2

## CL31A106KOHNNNE
designator C?  Capacitance: 10uF  (hidden comment: *)
Capacitor, Ceramic (MLCC), 10uF, ±10%, 16V, X5R, ±10%, SMD 1206; Manufacturer: Samsung Electro-Mechanics; Manufacturer Part Number: CL31A106KOHNNNE; Package Size: 1206; JLCPCB Basic Part: No; JLCPCB Part Number: C1849; Supplier 1: LCSC; Category: Capacitors - MLCC; Supplier Part Number 1: C1849; Tolerance: ±10%; Voltage Rating: 16V; Temperature Coefficient: X5R; RoHS: Yes; ComponentLink1Description: Datasheet; ComponentLink1URL: https://wmsc.lcsc.com/wmsc/upload/file/pdf/v2/lcsc/2304140030_Samsung-Electro-Mechanics-CL31A106KOHNNNE_C1849.pdf; ComponentLink2Description: JLCPCB Part URL; ComponentLink2URL: https://jlcpcb.com/partdetail/C1849; ComponentLink3Description: LCSC Part URL; ComponentLink3URL: https://lcsc.com/product-detail/Multilayer-Ceramic-Capacitors-MLCC---SMD-SMT_Samsung-Electro-Mechanics-Samsung-Electro-Mechanics-CL31A106KOHNNNE_C1849.html; ComponentLink4Description: Samsung Component Library; ComponentLink4URL: https://weblib.samsungsem.com/mlcc/mlcc-ec.do?partNumber=CL31A106KOHNNN
footprint CAP-1206 (1206 (3216M) Capacitor)
pins: 1, 2

## CL31A106KPHNNNE
designator C?  Capacitance: 10uF  (hidden comment: *)
Capacitor, Ceramic (MLCC), 10uF, ±10%, 10V, X5R, ±10%, SMD 1206; Manufacturer: Samsung Electro-Mechanics; Manufacturer Part Number: CL31A106KPHNNNE; Package Size: 1206; JLCPCB Basic Part: No; JLCPCB Part Number: C159760; Supplier 1: LCSC; Category: Capacitors - MLCC; Supplier Part Number 1: C159760; Tolerance: ±10%; Voltage Rating: 10V; Temperature Coefficient: X5R; RoHS: Yes; ComponentLink1Description: Datasheet; ComponentLink1URL: https://wmsc.lcsc.com/wmsc/upload/file/pdf/v2/lcsc/2304140030_Samsung-Electro-Mechanics-CL31A106KPHNNNE_C159760.pdf; ComponentLink2Description: JLCPCB Part URL; ComponentLink2URL: https://jlcpcb.com/partdetail/C159760; ComponentLink3Description: LCSC Part URL; ComponentLink3URL: https://lcsc.com/product-detail/Multilayer-Ceramic-Capacitors-MLCC---SMD-SMT_Samsung-Electro-Mechanics-Samsung-Electro-Mechanics-CL31A106KPHNNNE_C159760.html; ComponentLink4Description: Samsung Component Library; ComponentLink4URL: https://weblib.samsungsem.com/mlcc/mlcc-ec.do?partNumber=CL31A106KPHNNN
footprint CAP-1206 (1206 (3216M) Capacitor)
pins: 1, 2

## CL31A106KQHNNNE
designator C?  Capacitance: 10uF  (hidden comment: *)
Capacitor, Ceramic (MLCC), 10uF, ±10%, 6.3V, X5R, ±10%, SMD 1206; Manufacturer: Samsung Electro-Mechanics; Manufacturer Part Number: CL31A106KQHNNNE; Package Size: 1206; JLCPCB Basic Part: No; JLCPCB Part Number: C371976; Supplier 1: LCSC; Category: Capacitors - MLCC; Supplier Part Number 1: C371976; Tolerance: ±10%; Voltage Rating: 6.3V; Temperature Coefficient: X5R; RoHS: Yes; ComponentLink1Description: Datasheet; ComponentLink1URL: https://wmsc.lcsc.com/wmsc/upload/file/pdf/v2/lcsc/2304140030_Samsung-Electro-Mechanics-CL31A106KQHNNNE_C371976.pdf; ComponentLink2Description: JLCPCB Part URL; ComponentLink2URL: https://jlcpcb.com/partdetail/C371976; ComponentLink3Description: LCSC Part URL; ComponentLink3URL: https://lcsc.com/product-detail/Multilayer-Ceramic-Capacitors-MLCC---SMD-SMT_Samsung-Electro-Mechanics-Samsung-Electro-Mechanics-CL31A106KQHNNNE_C371976.html; ComponentLink4Description: Samsung Component Library; ComponentLink4URL: https://weblib.samsungsem.com/mlcc/mlcc-ec.do?partNumber=CL31A106KQHNNN
footprint CAP-1206 (1206 (3216M) Capacitor)
pins: 1, 2

## CL31A106MAHNNNE
designator C?  Capacitance: 10uF  (hidden comment: *)
Capacitor, Ceramic (MLCC), 10uF, ±20%, 25V, X5R, ±20%, SMD 1206; Manufacturer: Samsung Electro-Mechanics; Manufacturer Part Number: CL31A106MAHNNNE; Package Size: 1206; JLCPCB Basic Part: No; JLCPCB Part Number: C318763; Supplier 1: LCSC; Category: Capacitors - MLCC; Supplier Part Number 1: C318763; Tolerance: ±20%; Voltage Rating: 25V; Temperature Coefficient: X5R; RoHS: Yes; ComponentLink1Description: Datasheet; ComponentLink1URL: https://wmsc.lcsc.com/wmsc/upload/file/pdf/v2/lcsc/2309061353_Samsung-Electro-Mechanics-CL31A106MAHNNNE_C318763.pdf; ComponentLink2Description: JLCPCB Part URL; ComponentLink2URL: https://jlcpcb.com/partdetail/C318763; ComponentLink3Description: LCSC Part URL; ComponentLink3URL: https://lcsc.com/product-detail/Multilayer-Ceramic-Capacitors-MLCC---SMD-SMT_Samsung-Electro-Mechanics-Samsung-Electro-Mechanics-CL31A106MAHNNNE_C318763.html; ComponentLink4Description: Samsung Component Library; ComponentLink4URL: https://weblib.samsungsem.com/mlcc/mlcc-ec.do?partNumber=CL31A106MAHNNN
footprint CAP-1206 (1206 (3216M) Capacitor)
pins: 1, 2

## CL31A106MBHNNNE
designator C?  Capacitance: 10uF  (hidden comment: *)
Capacitor, Ceramic (MLCC), 10uF, ±20%, 50V, X5R, ±20%, SMD 1206; Manufacturer: Samsung Electro-Mechanics; Manufacturer Part Number: CL31A106MBHNNNE; Package Size: 1206; JLCPCB Basic Part: No; JLCPCB Part Number: C96600; Supplier 1: LCSC; Category: Capacitors - MLCC; Supplier Part Number 1: C96600; Tolerance: ±20%; Voltage Rating: 50V; Temperature Coefficient: X5R; RoHS: Yes; ComponentLink1Description: Datasheet; ComponentLink1URL: https://wmsc.lcsc.com/wmsc/upload/file/pdf/v2/lcsc/2304140030_Samsung-Electro-Mechanics-CL31A106MBHNNNE_C96600.pdf; ComponentLink2Description: JLCPCB Part URL; ComponentLink2URL: https://jlcpcb.com/partdetail/C96600; ComponentLink3Description: LCSC Part URL; ComponentLink3URL: https://lcsc.com/product-detail/Multilayer-Ceramic-Capacitors-MLCC---SMD-SMT_Samsung-Electro-Mechanics-Samsung-Electro-Mechanics-CL31A106MBHNNNE_C96600.html; ComponentLink4Description: Samsung Component Library; ComponentLink4URL: https://weblib.samsungsem.com/mlcc/mlcc-ec.do?partNumber=CL31A106MBHNNN
footprint CAP-1206 (1206 (3216M) Capacitor)
pins: 1, 2

## CL31A106MOHNNNE
designator C?  Capacitance: 10uF  (hidden comment: *)
Capacitor, Ceramic (MLCC), 10uF, ±20%, 16V, X5R, ±20%, SMD 1206; Manufacturer: Samsung Electro-Mechanics; Manufacturer Part Number: CL31A106MOHNNNE; Package Size: 1206; JLCPCB Basic Part: No; JLCPCB Part Number: C318765; Supplier 1: LCSC; Category: Capacitors - MLCC; Supplier Part Number 1: C318765; Tolerance: ±20%; Voltage Rating: 16V; Temperature Coefficient: X5R; RoHS: Yes; ComponentLink1Description: Datasheet; ComponentLink1URL: https://wmsc.lcsc.com/wmsc/upload/file/pdf/v2/lcsc/1912111437_Samsung-Electro-Mechanics-CL31A106MOHNNNE_C318765.pdf; ComponentLink2Description: JLCPCB Part URL; ComponentLink2URL: https://jlcpcb.com/partdetail/C318765; ComponentLink3Description: LCSC Part URL; ComponentLink3URL: https://lcsc.com/product-detail/Multilayer-Ceramic-Capacitors-MLCC---SMD-SMT_Samsung-Electro-Mechanics-Samsung-Electro-Mechanics-CL31A106MOHNNNE_C318765.html; ComponentLink4Description: Samsung Component Library; ComponentLink4URL: https://weblib.samsungsem.com/mlcc/mlcc-ec.do?partNumber=CL31A106MOHNNN
footprint CAP-1206 (1206 (3216M) Capacitor)
pins: 1, 2

## CL31A106MQHNNNE
designator C?  Capacitance: 10uF  (hidden comment: *)
Capacitor, Ceramic (MLCC), 10uF, ±20%, 6.3V, X5R, ±20%, SMD 1206; Manufacturer: Samsung Electro-Mechanics; Manufacturer Part Number: CL31A106MQHNNNE; Package Size: 1206; JLCPCB Basic Part: No; JLCPCB Part Number: C723915; Supplier 1: LCSC; Category: Capacitors - MLCC; Supplier Part Number 1: C723915; Tolerance: ±20%; Voltage Rating: 6.3V; Temperature Coefficient: X5R; RoHS: Yes; ComponentLink1Description: Datasheet; ComponentLink1URL: https://wmsc.lcsc.com/wmsc/upload/file/pdf/v2/lcsc/2008171907_Samsung-Electro-Mechanics-CL31A106MQHNNNE_C723915.pdf; ComponentLink2Description: JLCPCB Part URL; ComponentLink2URL: https://jlcpcb.com/partdetail/C723915; ComponentLink3Description: LCSC Part URL; ComponentLink3URL: https://lcsc.com/product-detail/Multilayer-Ceramic-Capacitors-MLCC---SMD-SMT_Samsung-Electro-Mechanics-Samsung-Electro-Mechanics-CL31A106MQHNNNE_C723915.html; ComponentLink4Description: Samsung Component Library; ComponentLink4URL: https://weblib.samsungsem.com/mlcc/mlcc-ec.do?partNumber=CL31A106MQHNNN
footprint CAP-1206 (1206 (3216M) Capacitor)
pins: 1, 2

## CL31A225KB9LNNC
designator C?  Capacitance: 2.2uF  (hidden comment: *)
Capacitor, Ceramic (MLCC), 2.2uF, ±10%, 50V, X5R, ±10%, SMD 1206; Manufacturer: Samsung Electro-Mechanics; Manufacturer Part Number: CL31A225KB9LNNC; Package Size: 1206; JLCPCB Basic Part: No; JLCPCB Part Number: C318758; Supplier 1: LCSC; Category: Capacitors - MLCC; Supplier Part Number 1: C318758; Tolerance: ±10%; Voltage Rating: 50V; Temperature Coefficient: X5R; RoHS: Yes; ComponentLink1Description: Datasheet; ComponentLink1URL: https://wmsc.lcsc.com/wmsc/upload/file/pdf/v2/lcsc/2304140030_Samsung-Electro-Mechanics-CL31A225KB9LNNC_C318758.pdf; ComponentLink2Description: JLCPCB Part URL; ComponentLink2URL: https://jlcpcb.com/partdetail/C318758; ComponentLink3Description: LCSC Part URL; ComponentLink3URL: https://lcsc.com/product-detail/Multilayer-Ceramic-Capacitors-MLCC---SMD-SMT_Samsung-Electro-Mechanics-Samsung-Electro-Mechanics-CL31A225KB9LNNC_C318758.html; ComponentLink4Description: Samsung Component Library; ComponentLink4URL: https://weblib.samsungsem.com/mlcc/mlcc-ec.do?partNumber=CL31A225KB9LNN
footprint CAP-1206 (1206 (3216M) Capacitor)
pins: 1, 2

## CL31A226KOCLNNC
designator C?  Capacitance: 22uF  (hidden comment: *)
Capacitor, Ceramic (MLCC), 22uF, ±10%, 16V, X5R, ±10%, SMD 1206; Manufacturer: Samsung Electro-Mechanics; Manufacturer Part Number: CL31A226KOCLNNC; Package Size: 1206; JLCPCB Basic Part: No; JLCPCB Part Number: C318754; Supplier 1: LCSC; Category: Capacitors - MLCC; Supplier Part Number 1: C318754; Tolerance: ±10%; Voltage Rating: 16V; Temperature Coefficient: X5R; RoHS: Yes; ComponentLink1Description: Datasheet; ComponentLink1URL: https://wmsc.lcsc.com/wmsc/upload/file/pdf/v2/lcsc/2304140030_Samsung-Electro-Mechanics-CL31A226KOCLNNC_C318754.pdf; ComponentLink2Description: JLCPCB Part URL; ComponentLink2URL: https://jlcpcb.com/partdetail/C318754; ComponentLink3Description: LCSC Part URL; ComponentLink3URL: https://lcsc.com/product-detail/Multilayer-Ceramic-Capacitors-MLCC---SMD-SMT_Samsung-Electro-Mechanics-Samsung-Electro-Mechanics-CL31A226KOCLNNC_C318754.html; ComponentLink4Description: Samsung Component Library; ComponentLink4URL: https://weblib.samsungsem.com/mlcc/mlcc-ec.do?partNumber=CL31A226KOCLNN
footprint CAP-1206 (1206 (3216M) Capacitor)
pins: 1, 2

## CL31A226KOHNNNE
designator C?  Capacitance: 22uF  (hidden comment: *)
Capacitor, Ceramic (MLCC), 22uF, ±10%, 16V, X5R, ±10%, SMD 1206; Manufacturer: Samsung Electro-Mechanics; Manufacturer Part Number: CL31A226KOHNNNE; Package Size: 1206; JLCPCB Basic Part: No; JLCPCB Part Number: C90146; Supplier 1: LCSC; Category: Capacitors - MLCC; Supplier Part Number 1: C90146; Tolerance: ±10%; Voltage Rating: 16V; Temperature Coefficient: X5R; RoHS: Yes; ComponentLink1Description: Datasheet; ComponentLink1URL: https://wmsc.lcsc.com/wmsc/upload/file/pdf/v2/lcsc/1810311713_Samsung-Electro-Mechanics-CL31A226KOHNNNE_C90146.pdf; ComponentLink2Description: JLCPCB Part URL; ComponentLink2URL: https://jlcpcb.com/partdetail/C90146; ComponentLink3Description: LCSC Part URL; ComponentLink3URL: https://lcsc.com/product-detail/Multilayer-Ceramic-Capacitors-MLCC---SMD-SMT_Samsung-Electro-Mechanics-Samsung-Electro-Mechanics-CL31A226KOHNNNE_C90146.html; ComponentLink4Description: Samsung Component Library; ComponentLink4URL: https://weblib.samsungsem.com/mlcc/mlcc-ec.do?partNumber=CL31A226KOHNNN
footprint CAP-1206 (1206 (3216M) Capacitor)
pins: 1, 2

## CL31A226KPHNNNE
designator C?  Capacitance: 22uF  (hidden comment: *)
Capacitor, Ceramic (MLCC), 22uF, ±10%, 10V, X5R, ±10%, SMD 1206; Manufacturer: Samsung Electro-Mechanics; Manufacturer Part Number: CL31A226KPHNNNE; Package Size: 1206; JLCPCB Basic Part: No; JLCPCB Part Number: C5672; Supplier 1: LCSC; Category: Capacitors - MLCC; Supplier Part Number 1: C5672; Tolerance: ±10%; Voltage Rating: 10V; Temperature Coefficient: X5R; RoHS: Yes; ComponentLink1Description: Datasheet; ComponentLink1URL: https://wmsc.lcsc.com/wmsc/upload/file/pdf/v2/lcsc/1810221121_Samsung-Electro-Mechanics-CL31A226KPHNNNE_C5672.pdf; ComponentLink2Description: JLCPCB Part URL; ComponentLink2URL: https://jlcpcb.com/partdetail/C5672; ComponentLink3Description: LCSC Part URL; ComponentLink3URL: https://lcsc.com/product-detail/Multilayer-Ceramic-Capacitors-MLCC---SMD-SMT_Samsung-Electro-Mechanics-Samsung-Electro-Mechanics-CL31A226KPHNNNE_C5672.html; ComponentLink4Description: Samsung Component Library; ComponentLink4URL: https://weblib.samsungsem.com/mlcc/mlcc-ec.do?partNumber=CL31A226KPHNNN
footprint CAP-1206 (1206 (3216M) Capacitor)
pins: 1, 2

## CL31A226KQHNNNE
designator C?  Capacitance: 22uF  (hidden comment: *)
Capacitor, Ceramic (MLCC), 22uF, ±10%, 6.3V, X5R, ±10%, SMD 1206; Manufacturer: Samsung Electro-Mechanics; Manufacturer Part Number: CL31A226KQHNNNE; Package Size: 1206; JLCPCB Basic Part: No; JLCPCB Part Number: C159759; Supplier 1: LCSC; Category: Capacitors - MLCC; Supplier Part Number 1: C159759; Tolerance: ±10%; Voltage Rating: 6.3V; Temperature Coefficient: X5R; RoHS: Yes; ComponentLink1Description: Datasheet; ComponentLink1URL: https://wmsc.lcsc.com/wmsc/upload/file/pdf/v2/lcsc/2304140030_Samsung-Electro-Mechanics-CL31A226KQHNNNE_C159759.pdf; ComponentLink2Description: JLCPCB Part URL; ComponentLink2URL: https://jlcpcb.com/partdetail/C159759; ComponentLink3Description: LCSC Part URL; ComponentLink3URL: https://lcsc.com/product-detail/Multilayer-Ceramic-Capacitors-MLCC---SMD-SMT_Samsung-Electro-Mechanics-Samsung-Electro-Mechanics-CL31A226KQHNNNE_C159759.html; ComponentLink4Description: Samsung Component Library; ComponentLink4URL: https://weblib.samsungsem.com/mlcc/mlcc-ec.do?partNumber=CL31A226KQHNNN
footprint CAP-1206 (1206 (3216M) Capacitor)
pins: 1, 2